# Altium footprint library MIC.PcbLib: 1 footprints
Each footprint in its own frame and in the unit in brackets; x right, y up, seen from the top. Pads: shape width x height; smd on the part's side, far side on the other; paste and mask are expansions set on the pad; w line width, h text height; cw(c..) or ccw(c..) is an arc to the next point about the centre after c.
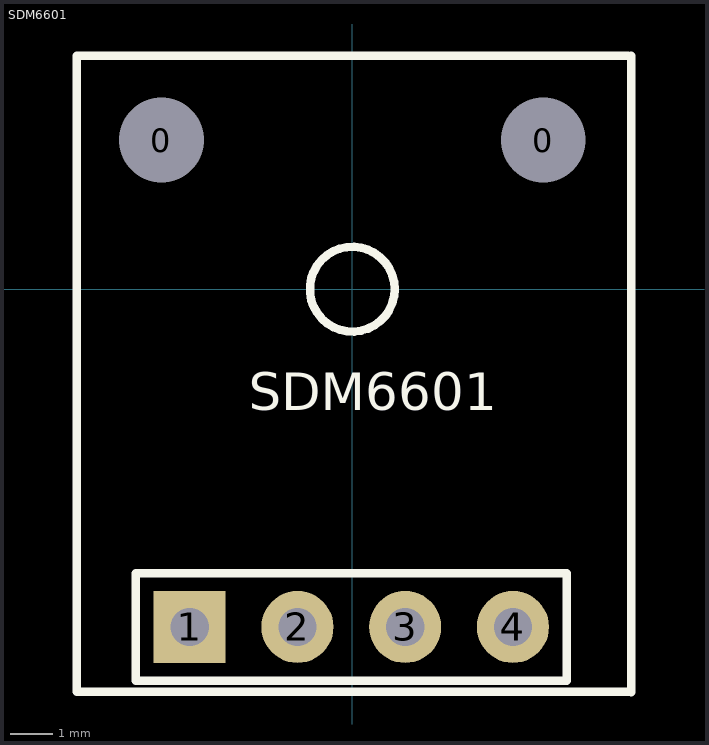
[diagram p0: the footprint, top view; thin cyan lines are the x and y axes]

## SDM6601 [mm]
pads (6):
  round 1 hole 2: 0(-4.5,3.514) 0(4.5,3.514)
  rect 1.7x1.7 hole 0.9: 1(-3.833,-7.962)
  round 1.7 hole 0.9: 2(-1.293,-7.962) 3(1.247,-7.962) 4(3.787,-7.962)
Top Overlay:
  circle w0.2: c0,0 r1
  lines w0.2: 6.5,-9.486 -6.5,-9.486 -6.5,5.5 6.5,5.5 ; 6.581,-9.5 6.581,5.5 ; -5.103,-9.232 5.057,-9.232 5.057,-6.692 -5.103,-6.692 -5.103,-9.232
  text "SDM6601" at -2.436,-3.153 h1.52